# Altium integrated library Op HiSpeed.IntLib: 28 symbols
Pins are listed as number, name and electrical type; pins without a type are passive.

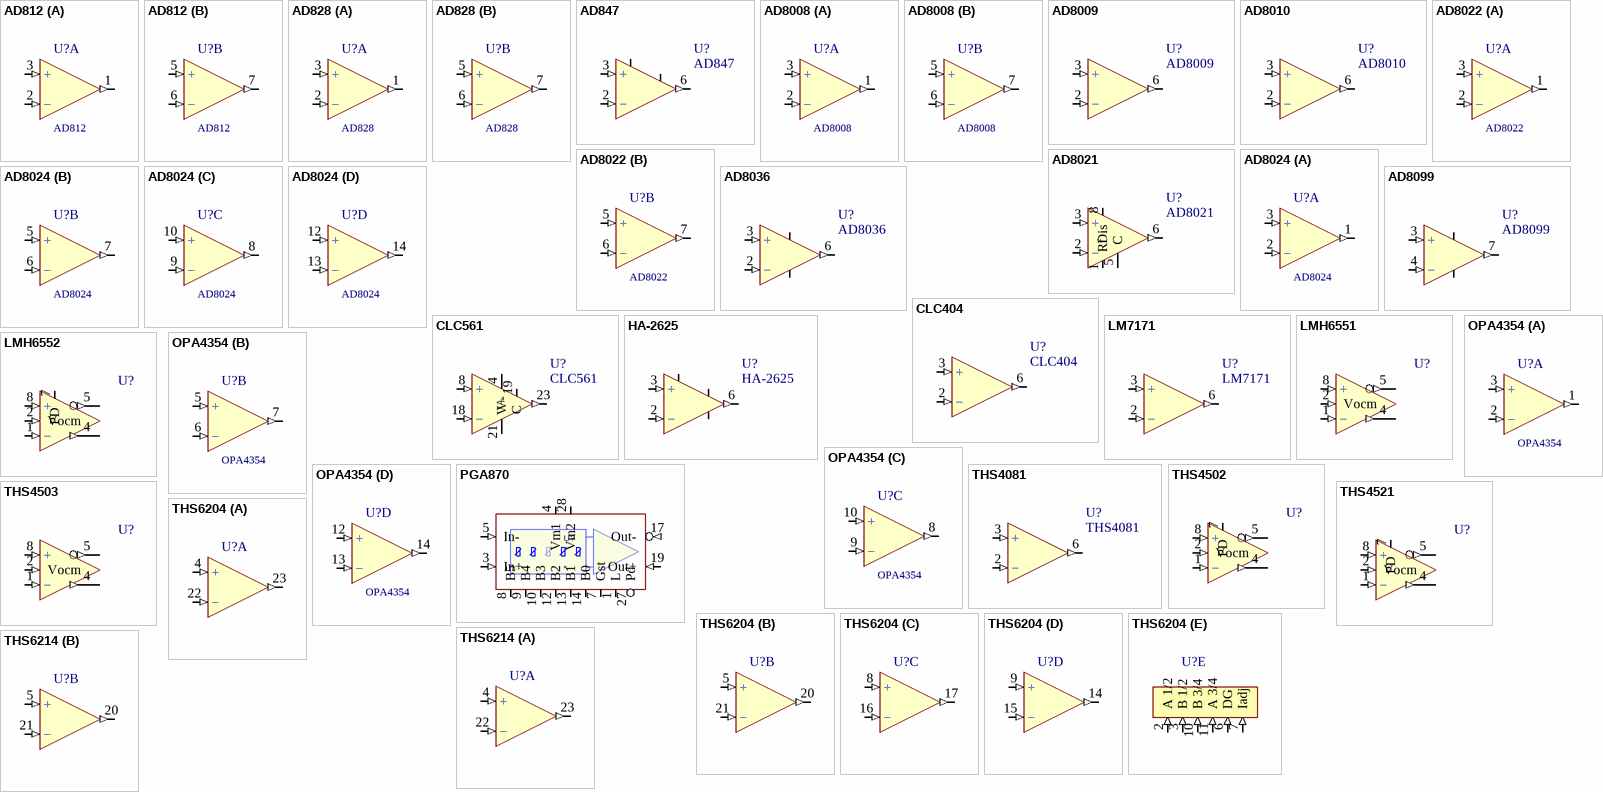
[diagram p0: symbols AD812 to THS6214]

## AD812
designator U?
Cur. 145MHz 600V/uS 4.5mA 36V; Price: 9.17
footprint DIL8-300a
simulation model AD812 (Model Description)
pins on every part: 4 V- (power) hidden to V-, 8 V+ (power) hidden to V+
part A pins: 1 OUT (out), 2 -IN (in), 3 +IN (in)
part B pins: 5 +IN (in), 6 -IN (in), 7 OUT (out)

## AD828
designator U?
150MHz  450V/uS 36V; Price: 14.43
footprint DIL8-300a
simulation model AD828 (Model Description)
pins on every part: 4 V- (power) hidden to V-, 8 V+ (power) hidden to V+
part A pins: 1 OUT (out), 2 -IN (in), 3 +IN (in)
part B pins: 5 +IN (in), 6 -IN (in), 7 OUT (out)

## AD847
designator U?
50MHz 300V/uS 36V
footprint DIL8-300a
simulation model AD847 (SubCKT)
pins: 1 Nul1, 2 -IN (in), 3 +IN (in), 4 V- (power) hidden to V-, 6 OUT (out), 7 V+ (power) hidden to V+, 8 Nul2

## AD8008
designator U?
650MHz  1000V/uS 8.1mA 12.6V; Price: 14.43
footprint DIL8-300a
simulation model AD8007 (Model Description)
pins on every part: 4 V- (power) hidden to V-, 8 V+ (power) hidden to V+
part A pins: 1 OUT (out), 2 -IN (in), 3 +IN (in)
part B pins: 5 +IN (in), 6 -IN (in), 7 OUT (out)

## AD8009
designator U?
1GHz 5500V/uS  14mA 12.6V; Price: 0.8
footprint DIL8-300a
simulation model AD8009AN (SUBCKT)
pins: 1 hidden, 2 -IN (in), 3 +IN (in), 4 V- (power) hidden to V-, 5 hidden, 6 OUT (out), 7 V+ (power) hidden to V+

## AD8010
designator U?
230MHz 800V/uS  (200mA) 15.5mA 12V; Price: 0.8
footprint DIL8-300a
simulation model AD8010 (SUBCKT)
pins: 1 hidden, 2 -IN (in), 3 +IN (in), 4 V- (power) hidden to V-, 5 hidden, 6 OUT (out), 7 V+ (power) hidden to V+

## AD8021
designator U?
520MHz 120V/uS  (60mA) 8mA 4.5-24V; Price: 3.6
footprint SO8-150
simulation model AD8021 (SUBCKT)
pins: 1 Rf, 2 -IN (in), 3 +IN (in), 4 V- (power) hidden to V-, 5 C (power), 6 OUT (out), 7 V+ (power) hidden to V+, 8 Dis (io)
1 alternate drawing of the same symbol

## AD8022
designator U?
130MHz  50V/uS 4mA 26V; Price: 9.17
footprint DIL8-300a
simulation model AD8022 (Model Description)
pins on every part: 4 V- (power) hidden to V-, 8 V+ (power) hidden to V+
part A pins: 1 OUT (out), 2 -IN (in), 3 +IN (in)
part B pins: 5 +IN (in), 6 -IN (in), 7 OUT (out)

## AD8024
designator U?
350MHz 390V/us 16mA Tot. 24V; Price: 0.454
footprint DIL14-300
simulation model AD8024 (Model Description)
pins on every part: 4 V+ (power) hidden to V+, 11 V- (power) hidden to V-
part A pins: 1 OUT (out), 2 IN- (in), 3 IN+ (in)
part B pins: 5 IN+ (in), 6 IN- (in), 7 OUT (out)
part C pins: 8 OUT (out), 9 IN- (in), 10 IN+ (in)
part D pins: 12 IN+ (in), 13 IN- (in), 14 OUT (out)

## AD8036
designator U?
240MHz 1500V/uS  20.5mA 12.6V; Price: 0.8
footprint DIL8-300a
simulation model AD8036AN (SUBCKT)
pins: 2 -IN (in), 3 +IN (in), 4 V- (power) hidden to V-, 5 Vl, 6 OUT (out), 7 V+ (power) hidden to V+, 8 Vh

## AD8099
designator U?
3.8GHz 475/uS  15mA 12.6V; Price: 0.8
footprint DIL8-300a
simulation model AD8099 (SUBCKT)
pins: 2 FB, 3 -IN (in), 4 +IN (in), 5 V- (power) hidden to V-, 6 Comp, 7 OUT (out), 8 V+ (power) hidden to V+

## CLC404
designator U?
140MHz 2000V/uS  12mA 14V; Price: 9
footprint SO8-150
simulation model CLC404 (Model Description)
pins: 2 -IN (in), 3 +IN (in), 4 V- (power) hidden to V-, 6 OUT (out), 7 V+ (power) hidden to V+

## CLC561
designator U?
135MHz  2900V/uS  Iout=0.25A 30V
footprint DIL24-600a
pins: 4 V+ (power), 5 G (power) hidden to g, 8 +IN (in), 10 G (power) hidden to g, 15 G (power) hidden to g, 18 -IN (in), 19 C, 20 G (power) hidden to g, 21 V- (power), 23 OUT (out)

## HA-2625
designator U?
100MHz 735V/uS  3mA 45V; Price: 0.8
footprint DIL8-300a
simulation model HA2620 (SUBCKT)
pins: 1 N1, 2 -IN (in), 3 +IN (in), 4 V- (power) hidden to V-, 5 N2, 6 OUT (out), 7 V+ (power) hidden to V+, 8 Comp

## LM7171
designator U?
200MHz 4000V/uS  (95mA) 8.5mA 5.5-36V; Price: 9
footprint SO8-150
simulation model LM7171A/NS (Model Description)
simulation model LM7171B/NS (Model Description)
pins: 2 -IN (in), 3 +IN (in), 4 V- (power) hidden to V-, 6 OUT (out), 7 V+ (power) hidden to V+

## LMH6551
designator U?
370MHz 2400V/uS  (50mA) 12.5mA 3-12V; Price: 8.85
footprint SO8-150
pins: 1 -In (in), 2 Vocm (in), 3 Vs+ (power) hidden to Vs+, 4 +Out (out), 5 -Out (out), 6 Vs- (power) hidden to Vs-, 8 +IN (in)

## LMH6552
designator U?
1500MHz 3800V/uS  (70mA) 22.5mA 4.5-12V; Price: 22
footprint SO8-150
pins: 1 -In (in), 2 Vocm (in), 3 Vs+ (power) hidden to Vs+, 4 +Out (out), 5 -Out (out), 6 Vs- (power) hidden to Vs-, 7 PD (in), 8 +IN (in)

## OPA4354
designator U?
250MHz 150V/us  8mV R/R In/Out 30mA 2.5-5.5V; Price: 2.6
footprint SO14-150
simulation model OPA4354 (Model Description)
pins on every part: 4 V+ (power) hidden to V+, 11 V- (power) hidden to V-
part A pins: 1 OUT (out), 2 IN- (in), 3 IN+ (in)
part B pins: 5 IN+ (in), 6 IN- (in), 7 OUT (out)
part C pins: 8 OUT (out), 9 IN- (in), 10 IN+ (in)
part D pins: 12 IN+ (in), 13 IN- (in), 14 OUT (out)

## PGA870
designator U?
650MHz 2900V/uS (140mA) 5V G -11.5-20dB; Price: 31.6
footprint QFN28N (28-Pin Plastic Quad Flat No-Lead 0.5 mm Pitch, IPC Medium Density)
pins: 0 TP (power) hidden to g, 1 L (in), 2 Vs+ (power) hidden to Vs+, 3 In+ (in), 4 Vm1 (in), 5 In- (in), 6 Vs+ (power) hidden to Vs+, 7 Gst (in), 8 B5 (in), 9 B4 (in), 10 B3 (in), 11 Vs+ (power) hidden to Vs+, 12 B2 (in), 13 B1 (in), 14 B0 (in), 15 G (power) hidden to g, 16 Vs+ (power) hidden to Vs+, 17 Out- (in), 18 G (power) hidden to g, 19 Out+ (in), 20 Vs+ (power) hidden to Vs+, 21 G (power) hidden to g, 22 G (power) hidden to g, 23 G (power) hidden to g, 24 G (power) hidden to g, 25 Vs+ (power) hidden to Vs+, 26 g (power) hidden to g, 27 Pd (in), 28 Vm2 (in)

## THS4081
designator U?
175MHz 230V/uS 33V; Price: 12
footprint DIL8-300a
simulation model THS4081 (Model Description)
pins: 2 In- (in), 3 In+ (in), 4 V- (power) hidden to V-, 5 hidden, 6 Out (out), 7 V+ (power) hidden to V+

## THS4502
designator U?
370MHz 2800V/uS  (100mA) 23mA 5-15V; Price: 20
footprint SO8-150
pins: 1 -In (in), 2 Vocm (in), 3 Vs+ (power) hidden to Vs+, 4 +Out (out), 5 -Out (out), 6 Vs- (power) hidden to Vs-, 7 PD (in), 8 +IN (in)

## THS4503
designator U?
370MHz 2800V/uS  (100mA) 23mA 5-15V; Price: 20
footprint SO8-150
pins: 1 -In (in), 2 Vocm (in), 3 Vs+ (power) hidden to Vs+, 4 +Out (out), 5 -Out (out), 6 Vs- (power) hidden to Vs-, 8 +IN (in)

## THS4521
designator U?
145MHz 490V/uS  (55mA) 1.2mA 2.5-5.5V; Price: 5.34
footprint SO8-150
pins: 1 -In (in), 2 Vocm (in), 3 Vs+ (power) hidden to Vs+, 4 +Out (out), 5 -Out (out), 6 Vs- (power) hidden to Vs-, 7 PD (in), 8 +IN (in)

## THS6204
designator U?
160MHz 3200V/us (0.4A) 16.2mA 24V; Price: 11
footprint TSSOP24 (Body Width 4.4 mm; Pitch 0.65 mm)
pins on every part: 1 Vs- (power) hidden to Vs-, 24 Vs+ (power) hidden to Vs+
part A pins: 4 IN+ (in), 12 Vs- (power) hidden to Vs-, 13 Vs+ (power) hidden to Vs+, 22 Fb (in), 23 OUT (out)
part B pins: 5 IN+ (in), 20 OUT (out), 21 IN- (in)
part C pins: 8 IN+ (in), 16 Fb (in), 17 OUT (out)
part D pins: 9 IN+ (in), 14 OUT (out), 15 Fb (in)
part E pins: 2 A 1/2 (in), 3 B 1/2 (in), 6 DG (in), 7 Iadj (in), 10 B 3/4 (in), 11 A 3/4 (in)

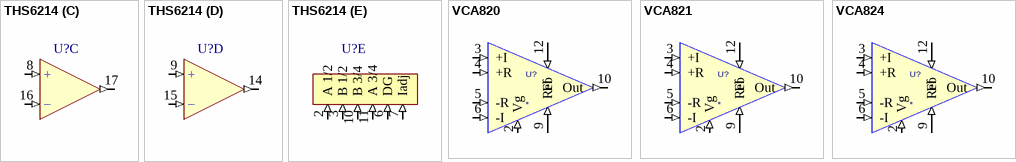
[diagram p1: symbols THS6214 to VCA824]

## THS6214
designator U?
160MHz 3200V/us (0.5A) 16.2mA 24V; Price: 12.73
footprint TSSOP24 (Body Width 4.4 mm; Pitch 0.65 mm)
pins on every part: 1 Vs- (power) hidden to Vs-, 24 Vs+ (power) hidden to Vs+
part A pins: 4 IN+ (in), 12 Vs- (power) hidden to Vs-, 13 Vs+ (power) hidden to Vs+, 22 Fb (in), 23 OUT (out)
part B pins: 5 IN+ (in), 20 OUT (out), 21 IN- (in)
part C pins: 8 IN+ (in), 16 Fb (in), 17 OUT (out)
part D pins: 9 IN+ (in), 14 OUT (out), 15 Fb (in)
part E pins: 0 TP (power) hidden to g, 2 A 1/2 (in), 3 B 1/2 (in), 6 DG (in), 7 Iadj (in), 10 B 3/4 (in), 11 A 3/4 (in)

## VCA820
designator U?
150MHz 1700v/uS (160mA) 7-12.6V 32mA 8.2nV/Hz; Price: 22
footprint SO14-150
pins: 1 V+ (power) hidden to -V, 2 Vg (in), 3 +I (in), 4 +R (in), 5 -R (in), 6 -I (in), 7 V- (power) hidden to -V, 8 V- (power) hidden to -V, 9 Ref (in), 10 Out (out), 12 Fb (in), 14 V+ (power) hidden to -V

## VCA821
designator U?
710MHz 2500v/uS (90mA) 7-12.6V 32mA 7nV/Hz; Price: 27
footprint SO14-150
pins: 1 V+ (power) hidden to -V, 2 Vg (in), 3 +I (in), 4 +R (in), 5 -R (in), 6 -I (in), 7 V- (power) hidden to -V, 8 V- (power) hidden to -V, 9 Ref (in), 10 Out (out), 12 Fb (in), 14 V+ (power) hidden to -V

## VCA824
designator U?
710MHz 2500v/uS (90mA) 7-12.6V 32mA 6nV/Hz; Price: 27
footprint SO14-150
pins: 1 V+ (power) hidden to -V, 2 Vg (in), 3 +I (in), 4 +R (in), 5 -R (in), 6 -I (in), 7 V- (power) hidden to -V, 8 V- (power) hidden to -V, 9 Ref (in), 10 Out (out), 12 Fb (in), 14 V+ (power) hidden to -V